# Altium footprint library USB Connectors.PcbLib: 40 footprints (part 1 of 3)
Each footprint in its own frame and in the unit in brackets; x right, y up, seen from the top. Pads: shape width x height; smd on the part's side, far side on the other; paste and mask are expansions set on the pad; w line width, h text height; cw(c..) or ccw(c..) is an arc to the next point about the centre after c.
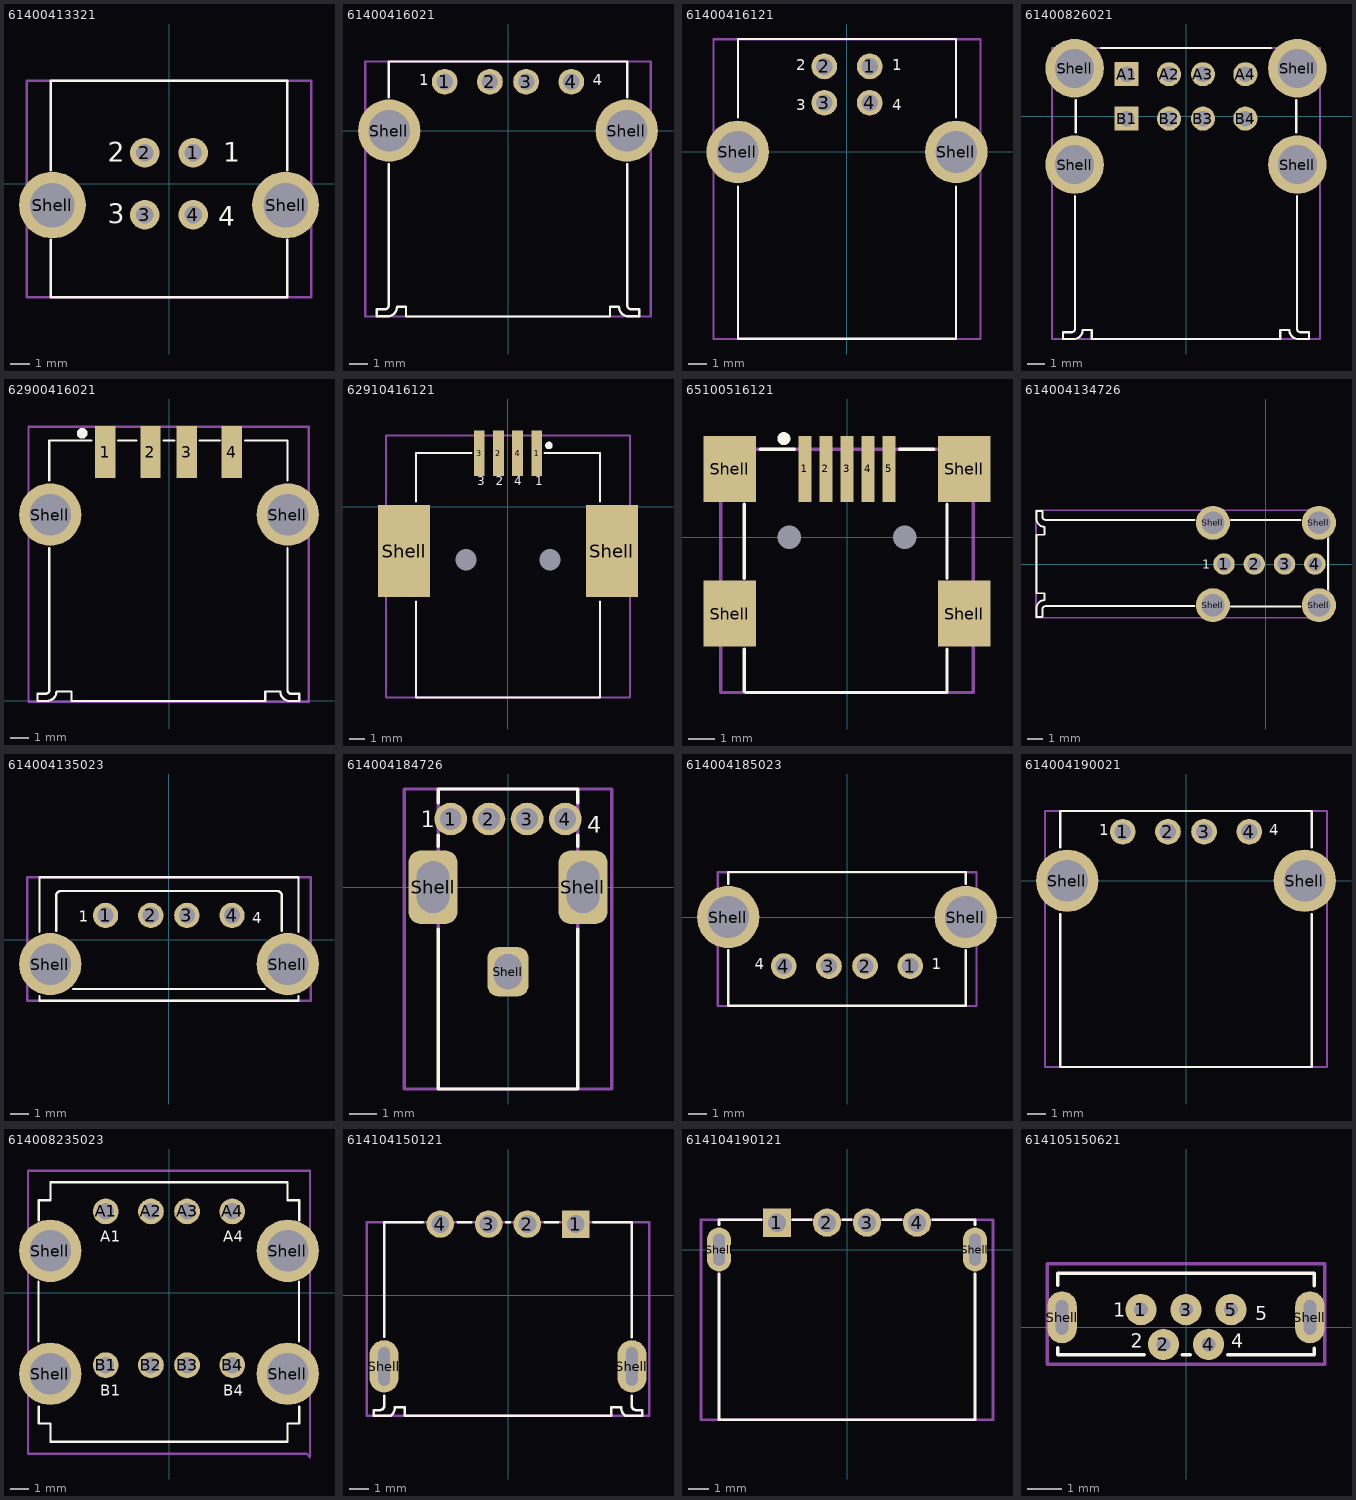
[diagram p0: the footprints below, top view; thin cyan lines are the x and y axes]

## 61400413321 [mm] "F Str 04p Btype vertical"
height 16.1
pads (6):
  round 1.52 hole 0.92: 1(1.25,1.6) 2(-1.25,1.6) 3(-1.25,-1.6) 4(1.25,-1.6)
  round 3.45 hole 2.3: Shell(-6.02,-1.1) Shell(6.02,-1.1)
Top Overlay:
  lines w0.127: -6.1,-2.9 -6.1,-5.87 6.1,-5.87 6.1,-2.9 ; -6.1,0.7 -6.1,5.33 6.1,5.33 6.1,0.7
  text "1" at 2.794,1.143 h1
  text "2" at -3.175,1.143 h1
  text "3" at -3.175,-2.032 h1
  text "4" at 2.54,-2.159 h1
Mechanical 13:
  lines w0.127: -7.345,-5.87 7.355,-5.87 7.355,5.33 -7.345,5.33 -7.345,-5.87
3D body: height 16.11, standoff -4.79, extent -7.345,-5.87 7.355,5.33

## 61400416021 [mm] "4 pins"
height 6.95
pads (6):
  round 1.428 hole 0.92: 1(-3.5,2.7) 2(-1,2.7) 3(1,2.7) 4(3.5,2.7)
  round 3.45 hole 2.3: Shell(-6.57,0) Shell(6.57,0)
Top Overlay:
  lines w0.127: -6.601,-1.85 -6.601,-9.683 cw(c-6.798,-9.683) -6.798,-9.88 -7.25,-9.88 -7.25,-10.275 -6.667,-10.275 ccw(c-6.667,-9.748) -6.14,-9.748 -5.64,-9.748 -5.64,-10.28 5.64,-10.28 5.64,-9.748 6.14,-9.748 ccw(c6.666,-9.748) 6.666,-10.275 7.25,-10.275 7.25,-9.88 6.798,-9.88 cw(c6.798,-9.683) 6.601,-9.683 6.601,-1.85 ; -6.6,1.85 -6.6,3.82 6.6,3.82 6.6,1.85
  text "1" at -4.9,2.5 h0.6
  text "4" at 4.7,2.5 h0.6
Mechanical 13:
  lines w0.127: -7.9,-10.28 -7.9,3.82 7.9,3.82 7.9,-10.28 -7.9,-10.28
3D body: height 7.71, standoff -3.69, extent -7.9,-10.28 7.9,3.82

## 61400416121 [mm] "WR-COM Horizontal USB Type B    4 pins"
height 10.7
pads (6):
  round 1.42 hole 0.92: 1(1.25,4.71) 2(-1.25,4.71) 3(-1.25,2.71) 4(1.25,2.71)
  round 3.45 hole 2.3: Shell(-6.02,0) Shell(6.02,0)
Top Overlay:
  lines w0.127: -6,-1.9 -6,-10.28 6,-10.28 6,-1.9 ; -6,1.9 -6,6.22 6,6.22 6,1.9
  text "1" at 2.5,4.5 h0.6
  text "4" at 2.5,2.3 h0.6
  text "2" at -2.8,4.5 h0.6
  text "3" at -2.8,2.3 h0.6
Mechanical 13:
  lines w0.127: -7.35,-10.3 7.35,-10.3 7.35,6.2 -7.35,6.2 -7.35,-10.3
3D body: height 10.95, standoff -4.05, extent -7.35,-10.3 7.35,6.2

## 61400826021 [mm] "2 x 4 pins"
height 15.34
pads (12):
  rect 1.42x1.42 hole 0.92: A1(-3.5,2.49) B1(-3.5,-0.13)
  round 1.42 hole 0.92: A2(-1,2.49) A3(1,2.49) A4(3.5,2.49) B2(-1,-0.13) B3(1,-0.13) B4(3.5,-0.13)
  round 3.45 hole 2.3: Shell(-6.57,-2.84) Shell(-6.57,2.84) Shell(6.57,-2.84) Shell(6.57,2.84)
Top Overlay:
  lines w0.127: -6.551,-4.7 -6.551,-12.528 cw(c-6.748,-12.528) -6.748,-12.725 -7.25,-12.725 -7.25,-13.12 -6.616,-13.12 ccw(c-6.616,-12.594) -6.09,-12.594 -5.56,-12.594 -5.56,-13.12 5.56,-13.12 5.56,-12.594 6.09,-12.594 ccw(c6.616,-12.594) 6.616,-13.12 7.25,-13.12 7.25,-12.725 6.748,-12.725 cw(c6.748,-12.528) 6.55,-12.528 6.55,-4.7 ; -6.5,-0.95 -6.5,0.95 ; -5,4.03 5,4.03 ; 6.5,-0.95 6.5,0.95
Mechanical 13:
  lines w0.127: -7.9,-13.12 7.9,-13.12 7.9,4.03 -7.9,4.03 -7.9,-13.12
3D body: height 16.25, standoff -3.66, extent -7.895,-13.12 7.895,4.03

## 62900416021 [mm] "4 pins"
height 6.72
pads (6):
  rect 1.12x2.88 smd: 1(-3.525,13.755) 2(-1.025,13.755) 3(0.975,13.755) 4(3.475,13.755)
  round 3.45 hole 2.3: Shell(-6.57,10.305) Shell(6.57,10.305)
Top Overlay:
  circle w0.3: c-4.8,14.8 r0.141
  lines w0.127: -6.817,0.395 -7.275,0.395 -7.275,0 -6.748,0 ccw(c-6.748,0.527) -6.222,0.527 -5.395,0.527 -5.395,0 5.33,0 5.33,0.522 6.157,0.522 ccw(c6.683,0.522) 6.683,-0.005 7.21,-0.005 7.21,0.39 6.752,0.39 ; -6.817,0.398 ccw(c-6.817,0.595) -6.62,0.595 -6.62,8.45 ; -6.62,12.2 -6.62,14.4 -4.3,14.4 ; -2.8,14.4 -1.8,14.4 ; -0.3,14.4 0.3,14.4 ; 1.7,14.4 2.8,14.4 ; 4.2,14.4 6.55,14.4 6.55,12.2 ; 6.555,8.45 6.555,0.59 ccw(c6.752,0.59) 6.752,0.393
Mechanical 13:
  lines w0.127: -7.773,-0.05 -7.773,15.155 7.723,15.155 7.723,-0.05 -7.773,-0.05
3D body: height 7.5, standoff -3.71, extent -7.773,-0.05 7.723,15.155

## 62910416121 [mm] "4 pins"
height 10.7
pads (8):
  rect 0.7x3 smd: 1(1.875,3.49) 2(-0.625,3.49) 3(-1.875,3.49) 4(0.625,3.49)
  rect 3.4x6.04 smd: Shell(-6.8,-2.91) Shell(6.8,-2.91)
  round 1 hole 1.4 unplated: ""(-2.75,-3.49) ""(2.75,-3.49)
Top Overlay:
  circle w0.254: c2.68,4 r0.12
  lines w0.127: -6.02,-6.2 -6.02,-12.51 6.02,-12.51 6.02,-6.2 ; -6.02,0.32 -6.02,3.51 -2.4,3.51 ; 2.4,3.51 6.02,3.51 6.02,0.32
  text "1" at 1.8,1.2 h1
  text "4" at 0.4,1.2 h1
  text "2" at -0.8,1.2 h1
  text "3" at -2,1.2 h1
Mechanical 13:
  lines w0.127: -8,-12.51 -8,4.64 8,4.64 8,-12.51 -8,-12.51
3D body: height 10.9, standoff -1.38, extent -8,-12.51 8,4.64

## 65100516121 [mm] "5 pins"
height 3.9
pads (11):
  rect 0.5x2.5 smd: 1(-1.6,2.6) 2(-0.8,2.6) 3(0,2.6) 4(0.8,2.6) 5(1.6,2.6)
  rect 2x2.5 smd: Shell(-4.45,-2.9) Shell(-4.45,2.6) Shell(4.45,-2.9) Shell(4.45,2.6)
  round 0.7 hole 0.9 unplated: ""(-2.2,0) ""(2.2,0)
Top Overlay:
  circle w0.254: c-2.4,3.75 r0.12
  lines w0.127: -3.9,-5.85 -3.9,-4.25 ; -3.9,-1.55 -3.9,1.25 ; -3.85,-5.9 3.8,-5.9 ; -3.3,3.35 -2,3.35 ; 2,3.35 3.3,3.35 ; 3.8,-5.85 3.8,-4.25 ; 3.8,-1.55 3.8,1.25
Mechanical 13:
  lines w0.127: -4.8,-5.9 -4.8,3.35 4.8,3.35 4.8,-5.9 -4.8,-5.9
3D body: height 3.9, standoff -1, extent -4.8,-5.9 4.8,3.35

## 614004134726 [mm] "4 pins"
height 14.5
pads (8):
  round 1.42 hole 0.92: 1(-2.77,0) 2(-0.77,0) 3(1.23,0) 4(3.23,0)
  round 2.25 hole 1.5: Shell(-3.5,-2.72) Shell(-3.5,2.72) Shell(3.5,-2.72) Shell(3.5,2.72)
Top Overlay:
  lines w0.127: -4.718,2.918 -14.558,2.918 cw(c-14.558,3.115) -14.755,3.115 -14.755,3.51 -15.15,3.51 -15.15,2.983 ccw(c-14.624,2.983) -14.624,2.457 -14.624,1.93 -15.15,1.93 -15.15,-1.93 -14.624,-1.93 -14.624,-2.391 ccw(c-14.624,-2.918) -15.15,-2.918 -15.15,-3.51 -14.821,-3.51 ccw(c-14.821,-3.444) -14.755,-3.444 -14.755,-2.983 cw(c-14.558,-2.983) -14.558,-2.786 -4.714,-2.786 ; -2.3,-2.8 2.3,-2.8 ; -2.3,2.9 2.3,2.9 ; 4.1,-1.7 4.1,1.7
  text "1" at -4.2,-0.3 h0.6
Mechanical 13:
  lines w0.127: -15.18,-3.55 -15.18,3.55 4.12,3.55 4.12,-3.55 -15.18,-3.55
3D body: height 3.4, standoff -14.89, extent -15.18,-3.55 4.12,3.55

## 614004135023 [mm] "4 pins"
height 14.9
pads (6):
  round 1.4 hole 0.9: 1(-3.51,1.35) 2(-1.01,1.35) 3(0.99,1.35) 4(3.49,1.35)
  round 3.45 hole 2.3: Shell(-6.58,-1.35) Shell(6.58,-1.35)
Top Overlay:
  lines w0.127: -7.175,-3.112 -7.175,-3.38 7.175,-3.38 7.175,-3.112 ; -7.175,0.445 -7.175,3.46 7.175,3.46 7.175,0.445 ; -6.25,0.5 -6.25,2.445 cw(c-6,2.445) -6,2.695 6,2.695 cw(c6,2.445) 6.25,2.445 6.25,0.5 ; -5.3,-2.725 5.3,-2.725
  text "1" at -5,1 h0.6
  text "4" at 4.6,0.9 h0.6
Mechanical 13:
  lines w0.127: -7.85,-3.38 7.85,-3.38 7.85,3.46 -7.85,3.46 -7.85,-3.38
3D body: height 3.47, standoff -15.33, extent -7.85,-3.38 7.85,3.46

## 614004184726 [mm] "Type A Up Right THT - Short Type"
height 14.2
pads (7):
  round 1.2 hole 0.8: 1(-2.1,2.5) 2(-0.7,2.5) 3(0.7,2.5) 4(2.1,2.5)
  rrect50% 1.8x2.7 hole 1.2 slot 1.9 at 90 deg: Shell(-2.75,0) Shell(2.75,0)
  rrect50% 1.5x1.8 hole 1 slot 1.3 at 90 deg: Shell(0,-3.1)
Top Overlay:
  lines w0.127: -2.56,-1.544 -2.56,-7.4 2.56,-7.4 2.56,-1.544 ; -2.56,1.5 -2.56,1.9 ; -2.56,3.1 -2.56,3.6 2.56,3.6 2.56,3.1 ; 2.56,1.5 2.56,1.9
  text "1" at -3.2,2.2 h0.6
  text "4" at 2.9,2 h0.6
Mechanical 13:
  lines w0.127: -2.56,-1.544 -2.56,3.322 ; 2.56,-1.544 2.56,3.195 ; -3.81,-7.4 -3.81,3.6 3.81,3.6 3.81,-7.4 -3.81,-7.4
3D body: height 14.35, standoff -2.69, extent -3.563,-7.38 3.55,3.62

## 614004185023 [mm] "Type A Vertical THT - with Clips - Short Type"
height 10
pads (6):
  round 1.42 hole 0.92: 1(3.5,-2.71) 2(1,-2.71) 3(-1,-2.71) 4(-3.5,-2.71)
  round 3.45 hole 2.3: Shell(-6.57,0) Shell(6.57,0)
Top Overlay:
  lines w0.127: -6.57,-1.83 -6.57,-4.91 6.57,-4.91 6.57,-1.83 ; -6.57,1.83 -6.57,2.49 6.57,2.49 6.57,1.83
  text "1" at 4.7,-2.9 h0.6
  text "4" at -5.1,-2.9 h0.6
Mechanical 13:
  lines w0.127: -7.14,-4.92 -7.14,2.48 7.16,2.48 7.16,-4.92 -7.14,-4.92
3D body: height 10.15, standoff -2.85, extent -7.14,-4.92 7.16,2.48

## 614004190021 [mm] "Type A Horizontal THT"
height 5.12
pads (6):
  round 1.42 hole 0.92: 1(-3.5,2.71) 2(-1,2.71) 3(1,2.71) 4(3.5,2.71)
  round 3.45 hole 2.3: Shell(-6.57,0) Shell(6.57,0)
Top Overlay:
  lines w0.127: -6.95,-1.85 -6.95,-10.3 6.95,-10.3 6.95,-1.85 ; -6.95,1.85 -6.95,3.85 6.95,3.85 6.95,1.85
  text "4" at 4.6,2.5 h0.6
  text "1" at -4.8,2.5 h0.6
Mechanical 13:
  lines w0.127: -7.8,-10.3 7.8,-10.3 7.8,3.85 -7.8,3.85 -7.8,-10.3
3D body: height 7.7, standoff -3.7, extent -7.85,-10.3 7.85,3.85

## 614008235023 [mm] "2 x 4 pins"
height 16.9
pads (12):
  round 1.42 hole 0.92: A1(-3.5,4.49) A2(-1,4.49) A3(1,4.49) A4(3.5,4.49) B1(-3.5,-4.01) B2(-1,-4.01) B3(1,-4.01) B4(3.5,-4.01)
  round 3.45 hole 2.3: Shell(-6.57,-4.49) Shell(-6.565,2.31) Shell(6.565,2.31) Shell(6.57,-4.49)
Top Overlay:
  lines w0.127: -7.22,-2.7 -7.22,0.6 ; -7.201,-6.3 -7.201,-7.24 -6.55,-7.24 -6.55,-8.24 6.55,-8.24 6.55,-7.24 7.2,-7.24 7.2,-6.3 ; -7.2,4 -7.2,5.1 -6.55,5.1 ; -6.55,5.1 -6.55,6.11 5.55,6.11 6.55,6.11 6.55,5.1 7.2,5.1 7.2,4 ; 7.19,-2.7 7.19,0.6
  text "A4" at 3,2.8 h0.6
  text "B4" at 3,-5.7 h0.6
  text "B1" at -3.8,-5.7 h0.6
  text "A1" at -3.8,2.8 h0.6
Mechanical 13:
  lines w0.127: -7.8,-8.915 -7.8,6.735 7.8,6.735 7.8,-9.1 7.615,-8.915 -7.8,-8.915
3D body: height 16.9, standoff -3.6, extent -7.8,-8.89 7.8,6.76

## 614104150121 [mm] "WR-COM_USB_Type A_Reverse Horizontal_THT Type A Reverse Horizontal THT - with Clips - Slim type for PCB thickness 1.20mm"
height 6.82
pads (6):
  rect 1.42x1.42 hole 0.92: 1(3.5,3.675)
  round 1.42 hole 0.92: 2(1,3.675) 3(-1,3.675) 4(-3.5,3.675)
  oval 1.5x2.7 hole 0.6 slot 2 at 90 deg: Shell(-6.4,-3.675) Shell(6.4,-3.675)
Top Overlay:
  lines w0.127: -6.4,-5.2 -6.4,-5.727 cw(c-6.606,-5.727) -6.606,-5.933 -6.948,-5.933 -6.948,-6.225 -6.06,-6.225 ; -6.4,-2.14 -6.4,3.775 -4.4,3.775 ; -6.046,-6.217 ccw(c-6.367,-5.798) -5.84,-5.798 -5.34,-5.798 -5.34,-6.225 5.34,-6.225 5.34,-5.799 5.84,-5.799 ccw(c6.367,-5.799) 6.04,-6.212 ; -2.6,3.775 -1.9,3.775 ; -0.1,3.775 0.1,3.775 ; 1.9,3.775 2.6,3.775 ; 4.4,3.775 6.4,3.775 6.4,-2.17 ; 6.05,-6.225 6.948,-6.225 6.948,-5.934 6.606,-5.934 cw(c6.606,-5.728) 6.4,-5.728 6.4,-5.2 ; -4.4,3.775 -4.4,3.775
Mechanical 13:
  lines w0.127: -7.3,-6.225 7.3,-6.225 7.3,3.775 -7.3,3.775 -7.3,-6.225
3D body: height 7.26, standoff -1.56, extent -7.3,-6.225 7.3,3.775

## 614104190121 [mm] "Type A Horizontal THT - Short Type"
height 5.86
pads (6):
  rect 1.42x1.42 hole 0.92: 1(-3.5,1.35)
  round 1.42 hole 0.92: 2(-1,1.35) 3(1,1.35) 4(3.5,1.35)
  oval 1.2x2.2 hole 0.6 slot 1.6 at 90 deg: Shell(-6.4,0) Shell(6.4,0)
Top Overlay:
  lines w0.127: -6.4,-1.2 -6.4,-8.5 6.4,-8.5 6.4,-1.2 ; -6.4,1.25 -6.4,1.5 -4.3,1.5 ; -2.7,1.5 -1.8,1.5 ; -0.2,1.5 0.2,1.5 ; 1.8,1.5 2.7,1.5 ; 4.3,1.5 6.4,1.5 6.4,1.25
Mechanical 13:
  lines w0.127: -7.3,-8.5 7.3,-8.5 7.3,1.5 -7.3,1.5 -7.3,-8.5
3D body: height 5.96, standoff -1.75, extent -7.3,-8.5 7.3,1.5

## 614105150621 [mm] "WR-COM_USB_Micro Type AB_Vertical_THT Micro Type AB Vertical THT"
height 5.61
pads (7):
  round 0.9 hole 0.4: 1(-1.3,0.5) 2(-0.65,-0.5) 3(0,0.5) 4(0.65,-0.5) 5(1.3,0.5)
  oval 0.85x1.5 hole 0.35 slot 1 at 90 deg: Shell(-3.575,0.28) Shell(3.575,0.28)
Top Overlay:
  lines w0.1: -3.7,-0.6 -3.7,-0.8 -1.2,-0.8 ; -3.7,1.2 -3.7,1.55 3.7,1.55 3.7,1.19 ; -0.11,-0.8 0.13,-0.8 ; 1.2,-0.8 3.7,-0.8 3.7,-0.61
  text "1" at -2.1,0.3 h0.4
  text "2" at -1.6,-0.6 h0.4
  text "4" at 1.3,-0.6 h0.4
  text "5" at 2,0.2 h0.4
Mechanical 13:
  lines w0.1: -3.995,-1.075 -3.995,1.825 4.005,1.825 4.005,-1.075 -3.995,-1.075
3D body: height 5.66, standoff -1.46, extent -3.995,-1.075 4.005,1.825